# Altium footprint library tik_handheld_pcblib.PcbLib: 46 footprints (part 3 of 3)
Each footprint in its own frame and in the unit in brackets; x right, y up, seen from the top. Pads: shape width x height; smd on the part's side, far side on the other; paste and mask are expansions set on the pad; w line width, h text height; cw(c..) or ccw(c..) is an arc to the next point about the centre after c.
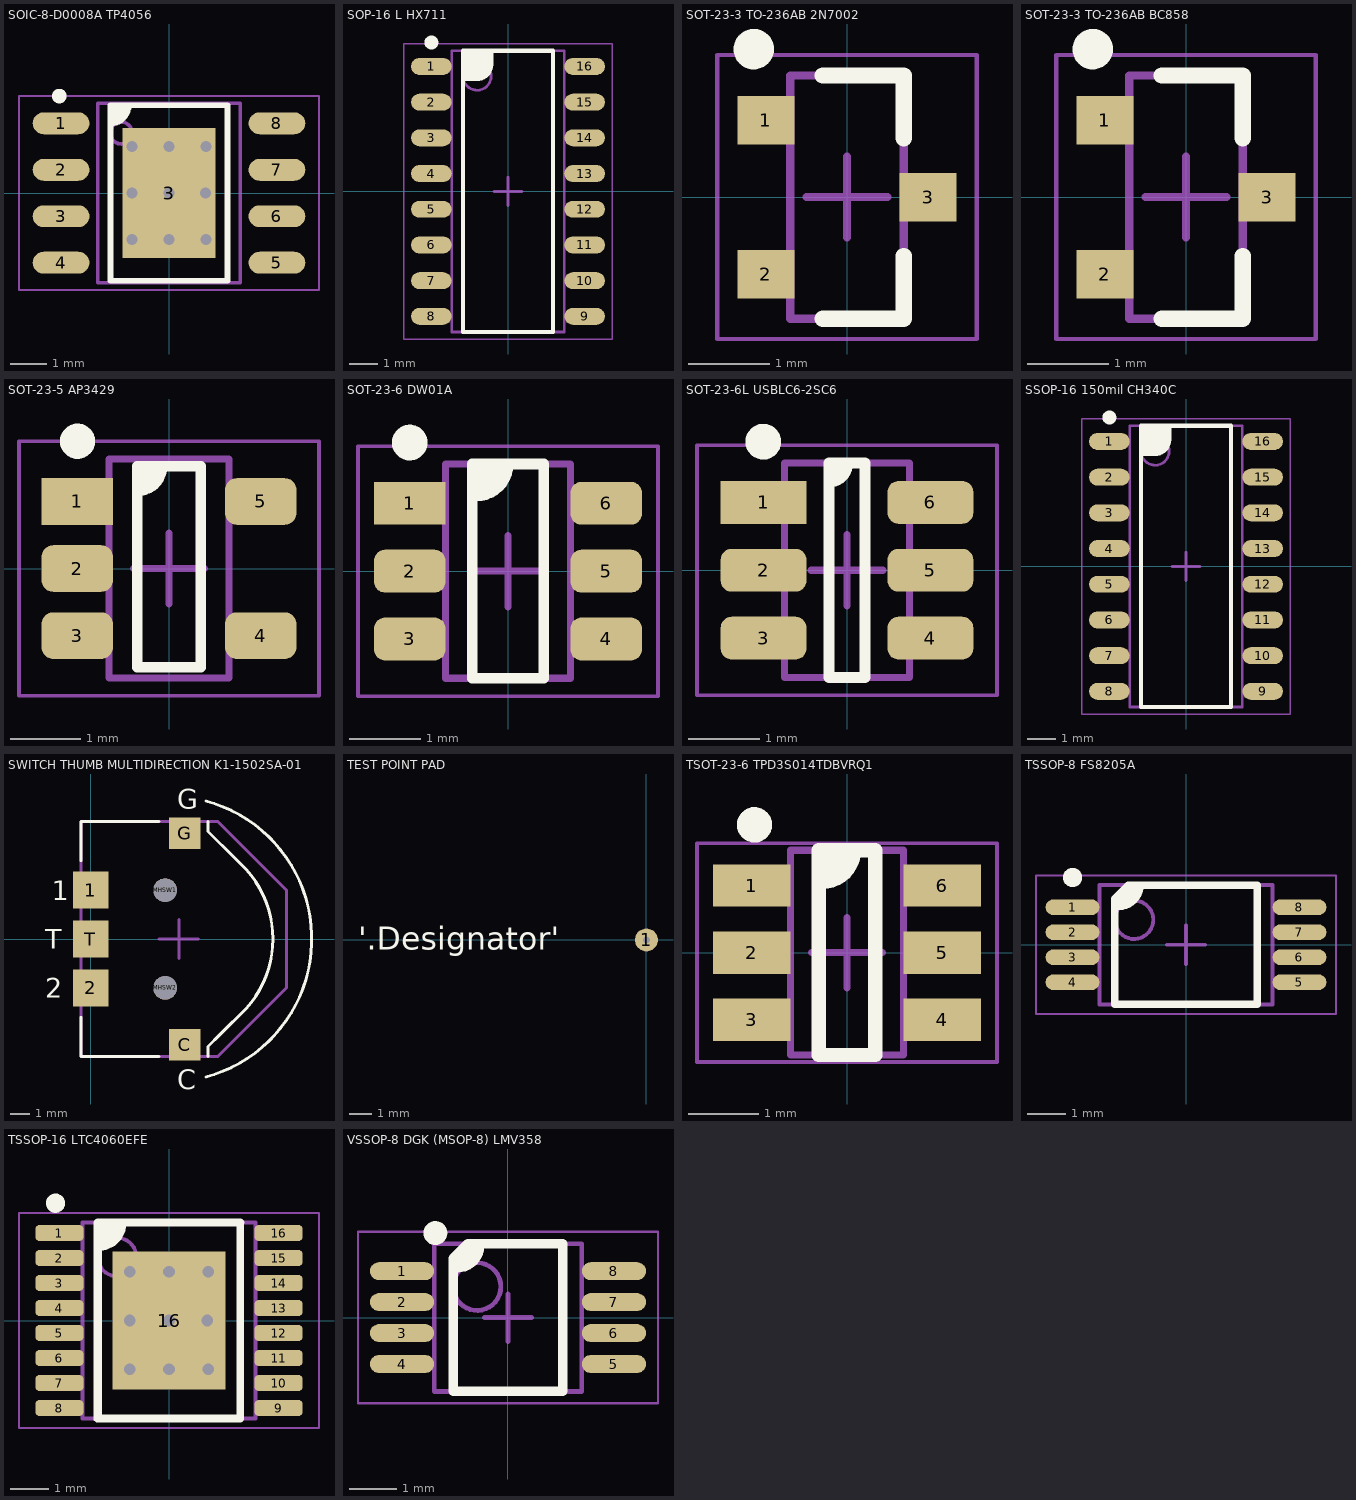
[diagram p2: the footprints below, top view; thin cyan lines are the x and y axes]

## SOIC-8-D0008A TP4056 [mm] "Package SOIC-8, 8-Leades, 4.90 x 3.89 mm Body , Pitch 1.27 mm"
height 1.75
pads (9):
  oval 1.55x0.6 smd: 1(-2.95,1.905) 2(-2.95,0.635) 3(-2.95,-0.635) 4(-2.95,-1.905) 5(2.95,-1.905) 6(2.95,-0.635) 7(2.95,0.635) 8(2.95,1.905)
  rect 2.54x3.56 smd: 3(0,0)
via -1.016,1.27 diameter 0.5 hole 0.3
via 1.016,1.27 diameter 0.5 hole 0.3
via 1.016,-1.27 diameter 0.5 hole 0.3
via -1.016,-1.27 diameter 0.5 hole 0.3
via 0,-1.27 diameter 0.5 hole 0.3
via -1.016,0 diameter 0.5 hole 0.3
via 0,1.27 diameter 0.5 hole 0.3
via 0,0 diameter 0.5 hole 0.3
via 1,0 diameter 0.5 hole 0.3
Top Overlay:
  circle w0.2: c-3,2.65 r0.1
  region: -1.6,2.4 -1.1,2.4 -1.1,2.2 -1.4,1.9 -1.6,1.9
  lines w0.152: -1.6,1.9 ccw(c-1.6,2.4) -1.1,2.4 ; -1.6,-2.4 -1.6,2.4 1.6,2.4 1.6,-2.4 -1.6,-2.4
Mechanical 13:
  circle w0.1: c-1.309,1.641 r0.3
  lines w0.1: -1.947,-2.452 1.947,-2.452 1.947,2.452 -1.947,2.452 -1.947,-2.452
Mechanical 15:
  lines w0.05: -4.1,-2.65 4.1,-2.65 4.1,2.65 -4.1,2.65 -4.1,-2.65
  lines w0.1: -1,0 0,0 ; 0,-1 0,0 ; 0,1 0,0 ; 1,0 0,0
3D body "TI - SOIC-8 - D008A v3.STEP": height 1.75, standoff 0, extent -3,-2.452 3,2.452

## SOP-16 L HX711 [mm] "SOP, 16-Leads, Body 9.90x3.90mm, Pitch 1.27mm, IPC Medium Density"
height 1.75
pads (16):
  oval 1.45x0.6 smd: 1(-2.725,4.445) 2(-2.725,3.175) 3(-2.725,1.905) 4(-2.725,0.635) 5(-2.725,-0.635) 6(-2.725,-1.905) 7(-2.725,-3.175) 8(-2.725,-4.445) 9(2.725,-4.445) 10(2.725,-3.175) 11(2.725,-1.905) 12(2.725,-0.635) 13(2.725,0.635) 14(2.725,1.905) 15(2.725,3.175) 16(2.725,4.445)
Top Overlay:
  circle w0.25: c-2.725,5.295 r0.125
  region: -1.6,5 -1.6,4 -0.9,4 -0.6,4.3 -0.6,5
  lines w0.152: -1.6,4 -1.1,4 ccw(c-1.1,4.5) -0.6,4.5 -0.6,5 ; -1.6,-5 1.6,-5 1.6,5 -1.6,5 -1.6,-5
Mechanical 13:
  circle w0.1: c-1.1,4.1 r0.5
  lines w0.1: -2,-5 2,-5 2,5 -2,5 -2,-5
Mechanical 15:
  lines w0.05: -3.7,-5.25 3.7,-5.25 3.7,5.25 -3.7,5.25 -3.7,-5.25
  lines w0.1: -0.5,0 0.5,0 ; 0,-0.5 0,0.5
3D body "TI SOP-16 D.step": height 1.75, standoff 0, extent -3,-5 3,5

## SOT-23-3 TO-236AB 2N7002 [mm] "SOT23, 3-Leads, Body 2.90x2.40mm, Pitch 0.95mm, IPC Medium Density"
height 1.35
pads (3):
  rect 0.7x0.6 smd: 1(-1,0.95) 2(-1,-0.95) 3(1,0)
Top Overlay:
  circle w0.25: c-1.15,1.825 r0.125
  lines w0.2: -0.3,-1.5 0.7,-1.5 0.7,-0.725 ; -0.3,1.5 0.7,1.5 0.7,0.725
Mechanical 13:
  lines w0.1: -0.7,-1.5 -0.7,1.5 0.7,1.5 0.7,-1.5 -0.7,-1.5
Mechanical 15:
  lines w0.05: -1.6,-1.75 -1.6,1.75 1.6,1.75 1.6,-1.75 -1.6,-1.75
  lines w0.1: -0.5,0 0.5,0 ; 0,-0.5 0,0.5
3D body "sot-23-3-nxp.STEP": height 1.5, standoff 0, extent -1.16,-1.45 1.16,1.45

## SOT-23-3 TO-236AB BC858 [mm] "SOT23, 3-Leads, Body 2.90x2.40mm, Pitch 0.95mm, IPC Medium Density"
height 1.35
pads (3):
  rect 0.7x0.6 smd: 1(-1,0.95) 2(-1,-0.95) 3(1,0)
Top Overlay:
  circle w0.25: c-1.15,1.825 r0.125
  lines w0.2: -0.3,-1.5 0.7,-1.5 0.7,-0.725 ; -0.3,1.5 0.7,1.5 0.7,0.725
Mechanical 13:
  lines w0.1: -0.7,-1.5 -0.7,1.5 0.7,1.5 0.7,-1.5 -0.7,-1.5
Mechanical 15:
  lines w0.05: -1.6,-1.75 -1.6,1.75 1.6,1.75 1.6,-1.75 -1.6,-1.75
  lines w0.1: -0.5,0 0.5,0 ; 0,-0.5 0,0.5
3D body "sot-23-3-nxp.STEP": height 1.5, standoff 0, extent -1.16,-1.45 1.16,1.45

## SOT-23-5 AP3429 [mil] "SOT23, 5-Leads, Body 3.00x2.85mm, Pitch 0.95mm, IPC Medium Density"
height 57.09
pads (5):
  rect 40x26 smd: 1(-51.18,37.4)
  rrect50% 40x26 smd: 2(-51.18,0) 3(-51.18,-37.4) 4(51.18,-37.4) 5(51.18,37.4)
Top Overlay:
  circle w9.84: c-51,71 r4.92
  region: -3.94,57.09 -15.75,57.09 -15.75,45.28 -17.72,43.31 -11.81,43.31 -7.87,47.24
  lines w6: -17.72,43.31 ccw(c-17.72,57.09) -3.94,57.09 ; -17.72,-55.12 17.72,-55.12 17.72,57.09 -17.72,57.09 -17.72,-55.12
Mechanical 13:
  lines w3.94: -33.46,-61.02 -33.46,61.02 33.46,61.02 33.46,-61.02 -33.46,-61.02
Mechanical 15:
  lines w1.97: -83.66,-70.87 -83.66,70.87 83.66,70.87 83.66,-70.87 -83.66,-70.87
  lines w3.94: -19.68,0 19.68,0 ; 0,-19.68 0,19.69
3D body "DIODES INC - SOT-23-5 - N.step": height 57.09, standoff 0, extent -59.05,-61.03 59.06,61.02

## SOT-23-6 DW01A [mm] "SOT23, 6-Leads, Body 2.90x2.80mm, Pitch 0.95mm, IPC Medium Density"
height 1.45
pads (6):
  rect 1x0.6 smd: 1(-1.375,0.95)
  rrect50% 1x0.6 smd: 2(-1.375,0) 3(-1.375,-0.95) 4(1.375,-0.95) 5(1.375,0) 6(1.375,0.95)
Top Overlay:
  circle w0.25: c-1.375,1.8 r0.125
  region: -0.5,1.5 0,1.5 0,1.35 -0.3,1.05 -0.5,1.05
  lines w0.152: -0.45,1.05 ccw(c-0.45,1.5) 0,1.5 ; -0.5,-1.5 0.5,-1.5 0.5,1.5 -0.5,1.5 -0.5,-1.5
Mechanical 13:
  lines w0.1: -0.875,-1.5 -0.875,1.5 0.875,1.5 0.875,-1.5 -0.875,-1.5
Mechanical 15:
  lines w0.05: -2.1,-1.75 -2.1,1.75 2.1,1.75 2.1,-1.75 -2.1,-1.75
  lines w0.1: -0.5,0 0.5,0 ; 0,-0.5 0,0.5
3D body "sot-23-6-atmel.STEP": height 1.45, standoff 0, extent -1.41,-1.45 1.41,1.45

## SOT-23-6L USBLC6-2SC6 [mm] "SOT23, 6-Leads, Body 2.90x2.80mm, Pitch 0.95mm, IPC Medium Density"
height 1.45
pads (6):
  rect 1.2x0.6 smd: 1(-1.168,0.95)
  rrect50% 1.2x0.6 smd: 2(-1.168,0) 3(-1.168,-0.95) 4(1.168,-0.95) 5(1.168,0) 6(1.168,0.95)
Top Overlay:
  circle w0.25: c-1.172,1.8 r0.125
  region: -0.282,1.52 0.043,1.52 0.043,1.37 -0.203,1.196 -0.282,1.196
  lines w0.152: -0.251,1.237 ccw(c-0.247,1.491) 0.007,1.491 ; -0.254,-1.5 0.254,-1.5 0.254,1.5 -0.254,1.5 -0.254,-1.5
Mechanical 13:
  lines w0.1: -0.875,-1.5 -0.875,1.5 0.875,1.5 0.875,-1.5 -0.875,-1.5
Mechanical 15:
  lines w0.05: -2.1,-1.75 -2.1,1.75 2.1,1.75 2.1,-1.75 -2.1,-1.75
  lines w0.1: -0.5,0 0.5,0 ; 0,-0.5 0,0.5
3D body "sot-23-6-atmel.STEP": height 1.45, standoff 0, extent -1.41,-1.45 1.41,1.45

## SSOP-16 150mil CH340C [mm] "SOP, 16-Leads, Body 9.90x3.90mm, Pitch 1.27mm, IPC Medium Density"
height 1.75
pads (16):
  oval 1.45x0.6 smd: 1(-2.725,4.445) 2(-2.725,3.175) 3(-2.725,1.905) 4(-2.725,0.635) 5(-2.725,-0.635) 6(-2.725,-1.905) 7(-2.725,-3.175) 8(-2.725,-4.445) 9(2.725,-4.445) 10(2.725,-3.175) 11(2.725,-1.905) 12(2.725,-0.635) 13(2.725,0.635) 14(2.725,1.905) 15(2.725,3.175) 16(2.725,4.445)
Top Overlay:
  circle w0.25: c-2.725,5.295 r0.125
  region: -1.6,5 -1.6,4 -0.9,4 -0.6,4.3 -0.6,5
  lines w0.152: -1.6,4 -1.1,4 ccw(c-1.1,4.5) -0.6,4.5 -0.6,5 ; -1.6,-5 -1.6,5 1.6,5 1.6,-5 -1.6,-5
Mechanical 13:
  circle w0.1: c-1.1,4.1 r0.5
  lines w0.1: -2,-5 -2,5 2,5 2,-5 -2,-5
Mechanical 15:
  lines w0.05: -3.7,-5.25 -3.7,5.25 3.7,5.25 3.7,-5.25 -3.7,-5.25
  lines w0.1: -0.5,0 0.5,0 ; 0,-0.5 0,0.5
3D body "TI SOP-16 D.step": height 1.75, standoff 0, extent -3,-5 3,5

## SWITCH THUMB MULTIDIRECTION K1-1502SA-01 [mm] "SWITCH THUMB MULTIDIRECTION K1-1502SA-01"
pads (7):
  rect 1.8x1.9 smd: 1(0,2.5) 2(0,-2.5) T(0,0)
  rect 1.6x1.6 smd: C(4.8,-5.4) G(4.8,5.4)
  round 1.2 hole 1.2 unplated: MHSW1(3.8,2.5) MHSW2(3.8,-2.5)
Top Overlay:
  lines w0.152: -0.5,-4 -0.5,-6 3.5,-6 ; -0.5,4 -0.5,6 3.5,6 ; 5.889,-7.051 ccw(c4,0) 5.889,7.051 ; 6,-6 6,-5.5 6.625,-4.875 6.625,-4.874 7.946,-3.554 ; 6,6 6,5.5 7.375,4.125 7.947,3.553 cw(c4,0) 7.946,-3.553 ; 7.946,-3.554 7.946,-3.553
  text "2" at -2.33,-3.008 h1.02
  text "T" at -2.33,-0.508 h1.02
  text "1" at -1.991,1.992 h1.02
  text "C" at 4.411,-7.668 h1.02
  text "G" at 4.411,6.652 h1.02
Mechanical 15:
  lines w0.152: 3.5,0 5.5,0 ; 4.5,-1 4.5,1 ; -0.5,-6 6.5,-6 10,-2.5 10,2.5 6.5,6 -0.5,6 -0.5,-6
3D body "SLLB510100_SCALED_CROP.STEP": height 3.05, standoff 0.03, extent -0.5,-8.704 11.342,8.75

## TEST POINT PAD [mil]
pads (1):
  round 40 hole 11.8: 1(0,0)
Top Overlay:
  text "'.Designator'" at -499.19,-16.66 h40
Bottom Overlay:
  text "'.Designator'" at -46,-16.66 h40

## TSOT-23-6 TPD3S014TDBVRQ1 [mm] "TSOT23, 6-Leads, Body 2.90x2.80mm, Pitch 0.95mm, IPC High Density"
height 1.1
pads (6):
  rrect1% 1.1x0.6 smd: 1(-1.35,0.95) 2(-1.35,0) 3(-1.35,-0.95) 4(1.35,-0.95) 5(1.35,0) 6(1.35,0.95)
Top Overlay:
  circle w0.25: c-1.31,1.81 r0.125
  region: -0.4,1.45 0.1,1.45 0.1,1.3 -0.2,1 -0.4,1
  lines w0.2: -0.4,1 -0.35,1 ccw(c-0.35,1.45) 0.1,1.45 ; -0.4,-1.45 -0.4,1.45 0.4,1.45 0.4,-1.45 -0.4,-1.45
Mechanical 13:
  lines w0.1: -0.8,-1.45 -0.8,1.45 0.8,1.45 0.8,-1.45 -0.8,-1.45
Mechanical 15:
  lines w0.05: -2.125,-1.55 2.125,-1.55 2.125,1.55 -2.125,1.55 -2.125,-1.55
  lines w0.1: -0.5,0 0.5,0 ; 0,-0.5 0,0.5
3D body "TI - TSOT-23-6 v2.step": height 1.1, standoff 0, extent -1.4,-1.45 1.4,1.45

## TSSOP-8 FS8205A [mm] "TSSOP, 8-Leads, Body 3.00x4.40mm, Pitch 0.65mm, IPC Medium Density"
height 1.2
pads (8):
  oval 1.4x0.406 smd: 1(-2.95,0.975) 2(-2.95,0.325) 3(-2.95,-0.325) 4(-2.95,-0.975) 5(2.95,-0.975) 6(2.95,-0.325) 7(2.95,0.325) 8(2.95,0.975)
Top Overlay:
  circle w0.25: c-2.95,1.75 r0.125
  region: -1.5,1.55 -1.2,1.55 -1.2,1.441 -1.284,1.238 -1.438,1.084 -1.641,1 -1.75,1 -1.85,1 -1.85,1.2
  lines w0.2: -1.85,1 -1.75,1 ccw(c-1.75,1.55) -1.2,1.55 ; -1.85,-1.55 -1.85,1.2 -1.5,1.55 1.85,1.55 1.85,-1.55 -1.85,-1.55
Mechanical 13:
  circle w0.1: c-1.35,0.65 r0.5
  lines w0.1: -2.25,-1.55 2.25,-1.55 2.25,1.55 -2.25,1.55 -2.25,-1.55
Mechanical 15:
  lines w0.05: -3.9,-1.8 3.9,-1.8 3.9,1.8 -3.9,1.8 -3.9,-1.8
  lines w0.1: -0.5,0 0.5,0 ; 0,-0.5 0,0.5
3D body "TSSOP-8.STEP": height 1.2, standoff 0, extent -3.21,-1.5 3.211,1.5

## TSSOP-16 LTC4060EFE [mm] "TSOP, 16-Leads, Body 5.00x4.40mm, Pitch 0.65mm, Thermal Pad"
height 1.2
pads (17):
  rrect50% 1.25x0.41 smd: 1(-2.85,2.275) 2(-2.85,1.625) 3(-2.85,0.975) 4(-2.85,0.325) 5(-2.85,-0.325) 6(-2.85,-0.975) 7(-2.85,-1.625) 8(-2.85,-2.275) 9(2.85,-2.275) 10(2.85,-1.625) 11(2.85,-0.975) 12(2.85,-0.325) 13(2.85,0.325) 14(2.85,0.975) 15(2.85,1.625) 16(2.85,2.275)
  rect 2.94x3.58 smd: 16(0,0)
via -1.016,1.27 diameter 0.5 hole 0.3
via 1.016,1.27 diameter 0.5 hole 0.3
via 1.016,-1.27 diameter 0.5 hole 0.3
via -1.016,-1.27 diameter 0.5 hole 0.3
via 0,-1.27 diameter 0.5 hole 0.3
via -1.016,0 diameter 0.5 hole 0.3
via 0,1.27 diameter 0.5 hole 0.3
via 0,0 diameter 0.5 hole 0.3
via 1,0 diameter 0.5 hole 0.3
Top Overlay:
  circle w0.25: c-2.95,3.05 r0.125
  region: -1.95,-2.55 -1.95,2.55 -1.95,2.57 -1.935,2.607 -1.907,2.635 -1.87,2.65 -1.85,2.65 1.85,2.65 1.87,2.65 1.907,2.635 1.935,2.607 1.95,2.57 1.95,2.55 1.95,2.53 1.935,2.493 1.907,2.465 1.87,2.45 1.85,2.45 -1.118,2.45 -1.135,2.33 -1.242,2.113 -1.413,1.942 -1.63,1.835 -1.75,1.818 -1.75,-2.55 -1.75,-2.592 -1.808,-2.65 -1.892,-2.65 -1.95,-2.592
  lines w0.1: -1.899,1.864 ccw(c-1.85,2.55) -1.162,2.55
  lines w0.2: -1.85,-2.55 1.85,-2.55 1.85,2.55 -1.85,2.55 -1.85,-2.55
Mechanical 13:
  circle w0.1: c-1.35,1.65 r0.5
  lines w0.1: -2.25,-2.55 2.25,-2.55 2.25,2.55 -2.25,2.55 -2.25,-2.55
Mechanical 15:
  lines w0.05: -3.9,-2.8 3.9,-2.8 3.9,2.8 -3.9,2.8 -3.9,-2.8
  lines w0.1: -0.5,0 0.5,0 ; 0,-0.5 0,0.5
3D body "TI - SOP-16 - PWP0016C v2.STEP": height 1.2, standoff 0, extent -3.2,-2.5 3.2,2.5

## VSSOP-8 DGK (MSOP-8) LMV358 [mm] "TSOP, 8-Leads, Body 3.00x3.00mm, Pitch 0.65mm, IPC Medium Density"
height 1.1
pads (8):
  oval 1.35x0.375 smd: 1(-2.225,0.975) 2(-2.225,0.325) 3(-2.225,-0.325) 4(-2.225,-0.975) 5(2.225,-0.975) 6(2.225,-0.325) 7(2.225,0.325) 8(2.225,0.975)
Top Overlay:
  circle w0.25: c-1.525,1.775 r0.125
  region: -1,1.4 -0.6,1.5 -0.6,1.35 -0.9,1.05 -1.1,1.05
  lines w0.2: -1.1,1.05 -1.05,1.05 ccw(c-1.05,1.5) -0.6,1.5 ; -1.15,-1.55 -1.15,1.25 -0.85,1.55 1.15,1.55 1.15,-1.55 -1.15,-1.55
Mechanical 13:
  circle w0.1: c-0.65,0.65 r0.5
  lines w0.1: -1.55,-1.55 1.55,-1.55 1.55,1.55 -1.55,1.55 -1.55,-1.55
Mechanical 15:
  lines w0.05: -3.15,-1.8 3.15,-1.8 3.15,1.8 -3.15,1.8 -3.15,-1.8
  lines w0.1: -0.5,0 0.5,0 ; 0,-0.5 0,0.5
3D body "TI VSSOP-8 DGK.STEP": height 1.1, standoff 0, extent -2.45,-1.5 2.45,1.5